# Altium footprint library PCB_LIB.PcbLib: 18 footprints (part 1 of 2)
Each footprint in its own frame and in the unit in brackets; x right, y up, seen from the top. Pads: shape width x height; smd on the part's side, far side on the other; paste and mask are expansions set on the pad; w line width, h text height; cw(c..) or ccw(c..) is an arc to the next point about the centre after c.
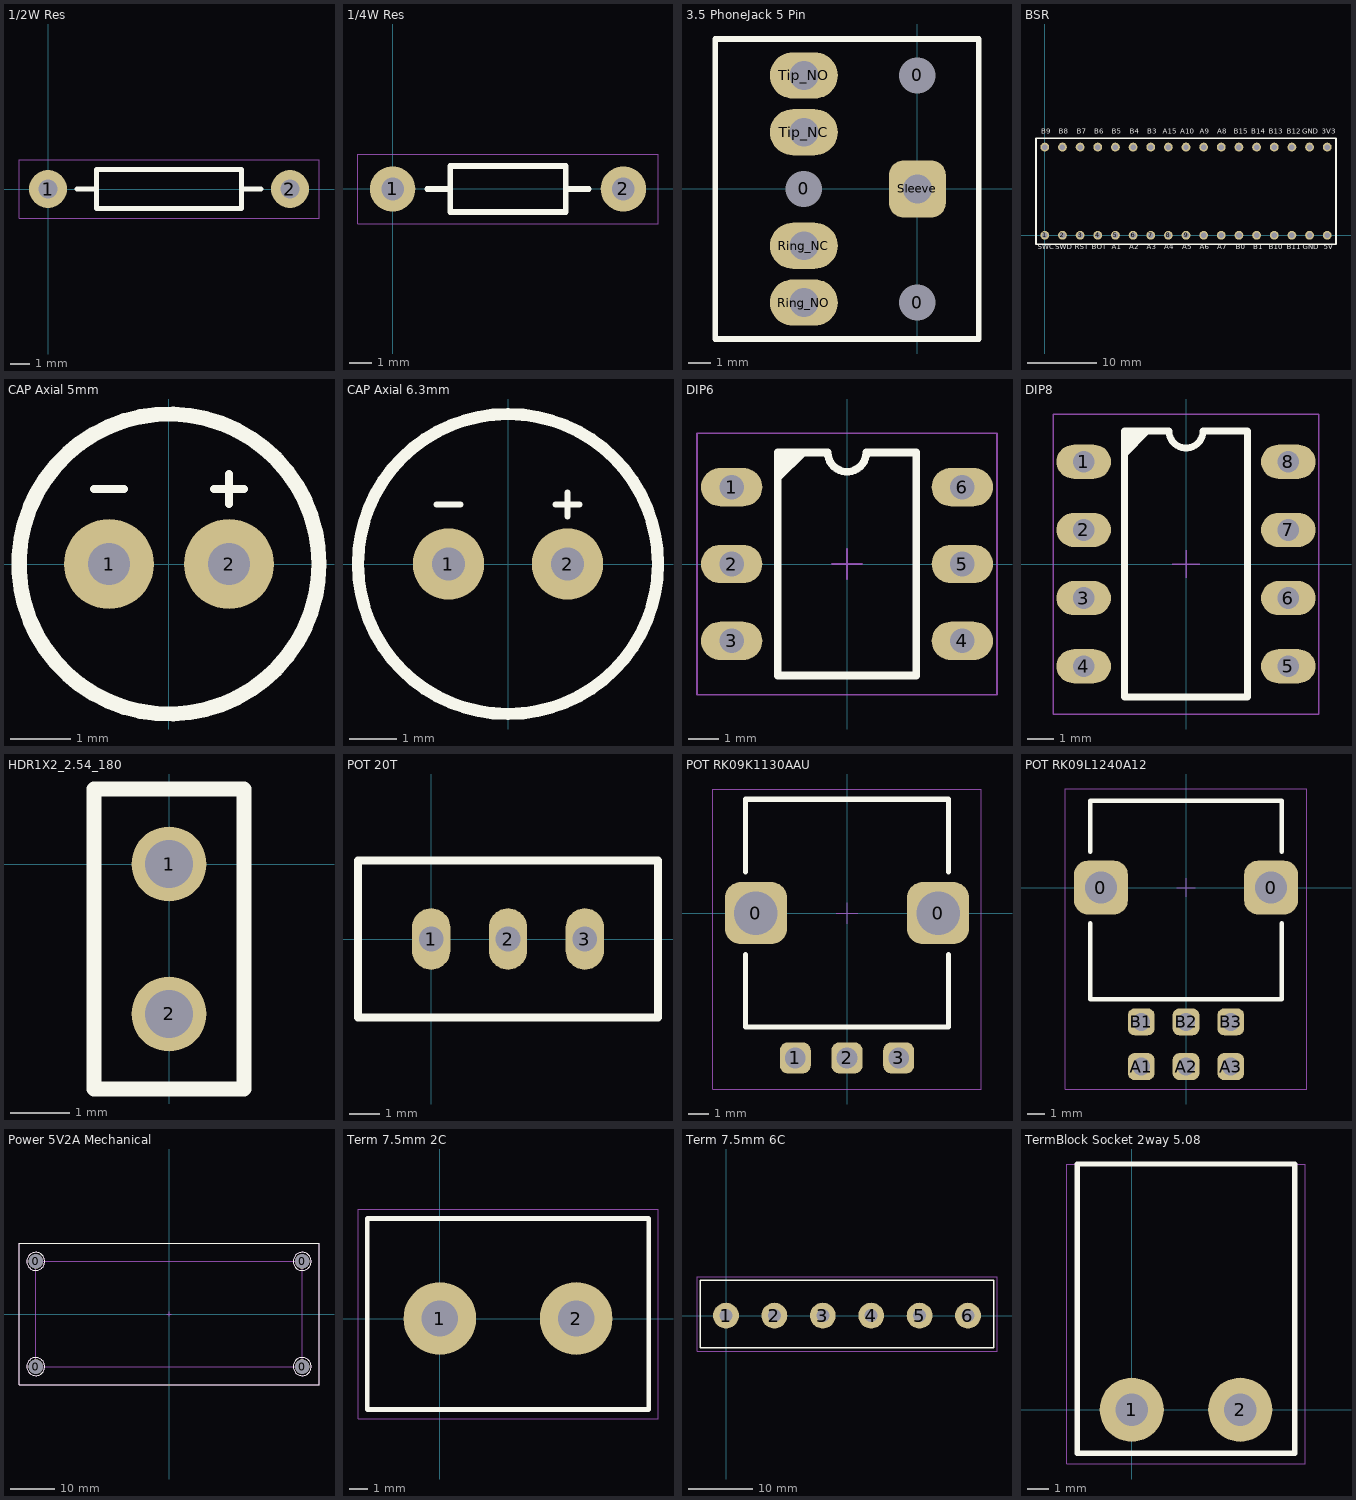
[diagram p0: the footprints below, top view; thin cyan lines are the x and y axes]

## 1/2W Res [mm] "1/2W Res"
pads (2):
  round 2 hole 1: 1(0,0) 2(12.7,0)
Top Overlay:
  lines w0.254: 1.524,0 2.54,0 ; 10.16,0 11.176,0 ; 2.54,-1.016 2.54,1.016 10.16,1.016 10.16,-1.016 2.54,-1.016
Mechanical 14:
  lines w0.051: -1.524,-1.524 -1.524,1.524 14.224,1.524 14.224,-1.524 -1.524,-1.524
3D body: height 3.88, standoff -5.5, extent -0.375,-1.875 13.075,1.875

## 1/4W Res [mm] "1/4W Res"
pads (2):
  round 2 hole 1: 1(0,0) 2(10.16,0)
Top Overlay:
  lines w0.254: 1.524,0 2.54,0 ; 7.62,0 8.636,0 ; 2.54,-1.016 2.54,1.016 7.62,1.016 7.62,-1.016 2.54,-1.016
Mechanical 14:
  lines w0.051: -1.524,-1.524 -1.524,1.524 11.684,1.524 11.684,-1.524 -1.524,-1.524
3D body: height 2.41, standoff -2, extent -0.3,-1.2 10.46,1.2

## 3.5 PhoneJack 5 Pin [mm] "Generic 3.5 PhoneJack 5 Pin  through-hole"
pads (8):
  round 1 hole 1.6 unplated: 0(-5,0) 0(0,-5) 0(0,5)
  oval 3x2.032 hole 1.27: Ring_NC(-5,-2.5) Ring_NO(-5,-5) Tip_NC(-5,2.5) Tip_NO(-5,5)
  rrect50% 2.5x2.5 hole 1.27: Sleeve(0,0)
Top Overlay:
  lines w0.254: -8.9,-6.604 2.7,-6.604 2.7,6.604 -8.9,6.604 -8.9,-6.604
Mechanical 14:
  lines w0.051: -8.9,-6.604 -8.9,6.604 2.7,6.604 2.7,-6.604 -8.9,-6.604
3D body: height 10, standoff -4.13, extent -8.475,-6 6.525,6

## BSR [mil] "BSR Board"
pads (34):
  round 50 hole 32: 1(0,0) 2(100,0) 3(200,0) 4(300,0) 5(400,0) 6(500,0) 7(600,0) 8(700,0) 9(800,0) 10(900,0) 11(1000,0) 12(1100,0) 13(1200,0) 14(1300,0) 15(1400,0)
  round 50 hole 31: 16(1500,0) 17(1600,0) 18(1600,500) 19(1500,500) 20(1400,500) 21(1300,500) 22(1200,500) 23(1100,500) 24(1000,500) 25(900,500) 26(800,500) 27(700,500) 28(600,500) 29(500,500) 30(400,500) 31(300,500) 32(200,500) 33(100,500) 34(0,500)
Top Overlay:
  lines w10: -50,-50 -50,550 1650,550 1650,-50 -50,-50
  text "GND" at 1461,-90 h50
  text "GND" at 1460,565 h50
  text "B12" at 1370,565 h50
  text "B13" at 1270,565 h50
  text "B14" at 1170,565 h50
  text "B15" at 1070,565 h50
  text "A8" at 977,565 h50
  text "A9" at 877,565 h50
  text "A10" at 768,565 h50
  text "B3" at 580,565 h50
  text "B4" at 480,565 h50
  text "B5" at 380,565 h50
  text "B6" at 280,565 h50
  text "B7" at 180,565 h50
  text "B8" at 80,565 h50
  text "B9" at -20,565 h50
  text "A15" at 668,565 h50
  text "B11" at 1371,-90 h50
  text "B10" at 1270,-90 h50
  text "B0" at 1081,-90 h50
  text "B1" at 1181,-90 h50
  text "A7" at 978,-90 h50
  text "A6" at 878,-90 h50
  text "A5" at 778,-90 h50
  text "A4" at 678,-90 h50
  text "A3" at 578,-90 h50
  text "A2" at 478,-90 h50
  text "A1" at 379,-90 h50
  text "RST" at 170,-90 h50
  text "5V" at 1580,-90 h50
  text "3V3" at 1568,565 h50
  text "BOT" at 267,-90 h50
  text "SWD" at 60,-90 h50
  text "SWC" at -40,-90 h50
Mechanical 14:
  lines w2: -50,-50 1650,-50 1650,550 -50,550 -50,-50
3D body: height 559.46, standoff 113.72, extent -121.54,-50.82 1654.97,549.18
3D body: height 334.65, standoff -125.98, extent -54.84,-50 1655,48.43
3D body: height 334.65, standoff -125.98, extent -54.84,450 1655,548.43

## CAP Axial 5mm [mm] "CAP Axial 5mm pitch 2mm"
pads (2):
  round 1.5 hole 0.7: 1(-1,0) 2(1,0)
Top Overlay:
  circle w0.254: c0,0 r2.5
  lines w0.127: -1.25,1.25 -0.75,1.25 ; 0.75,1.25 1.25,1.25 ; 1,1 1,1.5
Mechanical 14:
  circle w0.051: c0,0 r2.5
3D body: height 11.53, standoff -3.27, extent -2.525,-2.526 2.525,2.525

## CAP Axial 6.3mm [mm] "CAP Axial 6.3mm pitch 2.5mm"
pads (2):
  round 1.5 hole 0.7: 1(-1.25,0) 2(1.25,0)
Top Overlay:
  circle w0.254: c0,0 r3.15
  lines w0.127: -1.5,1.25 -1,1.25 ; 1,1.25 1.5,1.25 ; 1.25,1 1.25,1.5
Mechanical 14:
  circle w0.051: c0,0 r3.15
3D body: height 11.53, standoff -3.01, extent -3.175,-3.176 3.168,3.175

## DIP6 [mil] "DIP6"
pads (6):
  oval 80x50 hole 32: 1(-150,100) 2(-150,0) 3(-150,-100) 4(150,-100) 5(150,0) 6(150,100)
Top Overlay:
  region: -90,144.69 -50.63,144.69 -90,105.31
  lines w10: -90,-145 90,-145 90,145 25,145 cw(c0,145) -25,145 -90,145 -90,-145
Mechanical 13:
  lines w2: -20,0 20,0 ; 0,-20 0,20
Mechanical 14:
  lines w2: -195,-170 -195,170 195,170 195,-170 -195,-170
3D body: height 169.69, standoff -129.13, extent -157.48,-158 157.48,160.11

## DIP8 [mil] "DIP8"
pads (8):
  oval 80x50 hole 32: 1(-150,150) 2(-150,50) 3(-150,-50) 4(-150,-150) 5(150,-150) 6(150,-50) 7(150,50) 8(150,150)
Top Overlay:
  region: -90,194.69 -50.63,194.69 -90,155.31
  lines w10: -90,-195 90,-195 90,195 25,195 cw(c0,195) -25,195 -90,195 -90,-195
Mechanical 13:
  lines w2: -20,0 20,0 ; 0,-20 0,20
Mechanical 14:
  lines w2: -195,-220 -195,220 195,220 195,-220 -195,-220
3D body: height 200, standoff -137.8, extent -154.92,-210.96 154.92,218.96

## HDR1X2_2.54_180 [mil]
height 169.29
pads (2):
  round 50 hole 32: 1(0,0) 2(0,-100)
Top Overlay:
  lines w10: -50,-150 -50,50 50,50 50,-150 -50,-150
Mechanical 14:
  lines w2: -50,-150 -50,50 50,50 50,-150 -50,-150
3D body: height 322.83, standoff -118.11, extent -49.18,-150 49.18,50

## POT 20T [mil] "POT 20T"
pads (3):
  oval 50x80 hole 32: 1(0,0) 2(100,0) 3(200,0)
Top Overlay:
  lines w10: -95,-102 295,-102 295,102 -95,102 -95,-102
Mechanical 14:
  lines w2: -95,-102 295,-102 295,102 -95,102 -95,-102
3D body: height 454.72, standoff -62.99, extent -87.6,-94.49 287.6,94.49

## POT RK09K1130AAU [mm] "POT RK09K1130AAU"
pads (5):
  rrect50% 3x3 hole 2.1: 0(-4.4,0) 0(4.4,0)
  rrect50% 1.5x1.5 hole 1: 1(-2.5,-7) 2(0,-7) 3(2.5,-7)
Top Overlay:
  lines w0.254: -4.9,-2 -4.9,-5.5 0,-5.5 4.9,-5.5 4.9,-2 ; -4.9,2 -4.9,5.5 0,5.5 4.9,5.5 4.9,2
Mechanical 13:
  lines w0.051: -0.508,0 0.508,0 ; 0,-0.508 0,0.508
Mechanical 14:
  lines w0.051: -6.5,-8.5 6.5,-8.5 6.5,6 -6.5,6 -6.5,-8.5
3D body: height 20, standoff -3.7, extent -5.7,-7.15 5.698,5.5

## POT RK09L1240A12 [mm] "POT RK09L1240A12"
pads (8):
  rrect50% 3x3 hole 1.8: 0(-4.75,0) 0(4.75,0)
  rrect50% 1.5x1.5 hole 1: A1(-2.5,-10) A2(0,-10) A3(2.5,-10) B1(-2.5,-7.5) B2(0,-7.5) B3(2.5,-7.5)
Top Overlay:
  lines w0.254: -5.35,-2 -5.35,-6.25 5.35,-6.25 5.35,-2 ; -5.35,2 -5.35,4.85 0,4.85 5.35,4.85 5.35,2
Mechanical 13:
  lines w0.051: -0.508,0 0.508,0 ; 0,-0.508 0,0.508
Mechanical 14:
  lines w0.051: -6.75,-11.25 -6.75,5.5 0,5.5 6.75,5.5 6.75,-11.25 -6.75,-11.25
3D body: height 30, standoff -3.64, extent -6.048,-10.15 6.05,4.85

## Power 5V2A Mechanical [mm] "Power 5V2A Mechanical"
pads (4):
  round 3.2 hole 3.2 unplated: 0(-29.75,11.75) 0(-29.75,-11.75) 0(29.75,-11.75) 0(29.75,11.75)
Top Overlay:
  circle w0.254: c29.75,-11.75 r2
  circle w0.254: c29.75,11.75 r2
  circle w0.254: c-29.75,-11.75 r2
  circle w0.254: c-29.75,11.75 r2
  lines w0.254: -33.5,-15.75 -33.5,15.75 33.5,15.75 33.5,-15.75 -33.5,-15.75
Mechanical 13:
  lines w0.051: -0.508,0 0.508,0 ; 0,-0.508 0,0.508 ; -29.75,-11.75 29.75,-11.75 29.75,11.75 -29.75,11.75 -29.75,-11.75
Mechanical 14:
  circle w0.051: c29.75,11.75 r2
  circle w0.051: c29.75,-11.75 r2
  circle w0.051: c-29.75,-11.75 r2
  circle w0.051: c-29.75,11.75 r2
  lines w0.051: -33.5,-15.75 -33.5,15.75 33.5,15.75 33.5,-15.75 -33.5,-15.75
3D body: height 21.8, standoff 10.2, extent -33.5,-15.75 33.5,15.75
3D body: height 10.1, standoff 0.1, extent -32.637,9.25 -26.863,14.25
3D body: height 10.1, standoff 0.1, extent -32.637,-14.25 -26.863,-9.25
3D body: height 10.1, standoff 0.1, extent 26.863,-14.25 32.637,-9.25
3D body: height 10.1, standoff 0.1, extent 26.863,9.25 32.637,14.25

## Term 7.5mm 2C [mm] "Term 7.5mm 2C"
pads (2):
  round 4 hole 2: 1(0,0) 2(7.5,0)
Top Overlay:
  lines w0.254: -4,-5 11.5,-5 11.5,5.5 -4,5.5 -4,-5
Mechanical 14:
  lines w0.051: -4.5,-5.5 12,-5.5 12,6 -4.5,6 -4.5,-5.5
3D body: height 14.2, standoff -3.5, extent -4.325,-4.85 11.275,5.45

## Term 7.5mm 6C [mm] "Term 7.5mm 6C"
pads (6):
  round 4 hole 2: 1(0,0) 2(7.5,0) 3(15,0) 4(22.5,0) 5(30,0) 6(37.5,0)
Top Overlay:
  lines w0.254: -4,-5 41.5,-5 41.5,5.5 -4,5.5 -4,-5
Mechanical 14:
  lines w0.051: -4.5,-5.5 42,-5.5 42,6 -4.5,6 -4.5,-5.5
3D body: height 14.2, standoff -3.5, extent -4.35,-4.8 41.25,5.5

## TermBlock Socket 2way 5.08 [mm] "TermBlock Socket 90d 2wall 2way 5.08"
pads (2):
  round 3 hole 1.5: 1(0,0) 2(5.08,0)
Top Overlay:
  lines w0.254: -2.54,-2.032 -2.54,11.5 7.62,11.5 7.62,-2.032 -2.54,-2.032
Mechanical 14:
  lines w0.051: -3.048,-2.54 -3.048,11.5 8.128,11.5 8.128,-2.54 -3.048,-2.54
3D body: height 8.5, standoff -3.49, extent -2.54,-1.992 7.62,10.008